# Altium schematic symbol library jlcpcb_2025_04_inductors_extended_0805.schlib: 882 symbols (part 4 of 5) (continued)
## MLZ2012M1R0HT000
designator L?  Inductance: 1uH
Inductor, 1uH, ±20%, 100mΩ, 800mA, SMD 0805; Manufacturer: TDK; Manufacturer Part Number: MLZ2012M1R0HT000; Saturation Current: 700mA; Package Size: 0805; JLCPCB Basic Part: No; JLCPCB Part Number: C383403; Supplier 1: LCSC; Category: Inductors; Supplier Part Number 1: C383403; Tolerance: ±20%; Rated Current: 800mA; DC Resistance: 100mΩ; RoHS: Yes; ComponentLink1Description: Datasheet; ComponentLink1URL: https://wmsc.lcsc.com/wmsc/upload/file/pdf/v2/lcsc/2304140030_TDK-MLZ2012M1R0HT000_C383403.pdf; ComponentLink2Description: JLCPCB Part URL; ComponentLink2URL: https://jlcpcb.com/partdetail/C383403; ComponentLink3Description: LCSC Part URL; ComponentLink3URL: https://lcsc.com/product-detail/Inductors-SMD_TDK-TDK-MLZ2012M1R0HT000_C383403.html
footprint IND-0805 (0805 (2012M) Inductor)
pins: 1, 2

## MLZ2012M1R0HTD25
designator L?  Inductance: 1uH
Inductor, 1uH, ±20%, 100mΩ, 800mA, SMD 0805; Manufacturer: TDK; Manufacturer Part Number: MLZ2012M1R0HTD25; Saturation Current: 700mA; Package Size: 0805; JLCPCB Basic Part: No; JLCPCB Part Number: C380016; Supplier 1: LCSC; Category: Inductors; Supplier Part Number 1: C380016; Tolerance: ±20%; Rated Current: 800mA; DC Resistance: 100mΩ; RoHS: Yes; ComponentLink1Description: Datasheet; ComponentLink1URL: https://wmsc.lcsc.com/wmsc/upload/file/pdf/v2/lcsc/1912111437_TDK-MLZ2012M1R0HTD25_C380016.pdf; ComponentLink2Description: JLCPCB Part URL; ComponentLink2URL: https://jlcpcb.com/partdetail/C380016; ComponentLink3Description: LCSC Part URL; ComponentLink3URL: https://lcsc.com/product-detail/Inductors-SMD_TDK-TDK-MLZ2012M1R0HTD25_C380016.html
footprint IND-0805 (0805 (2012M) Inductor)
pins: 1, 2

## MLZ2012M2R2HT000
designator L?  Inductance: 2.2uH
Inductor, 2.2uH, ±20%, 160mΩ, 600mA, SMD 0805; Manufacturer: TDK; Manufacturer Part Number: MLZ2012M2R2HT000; Saturation Current: 400mA; Self-Resonant Frequency: 2MHz; Package Size: 0805; JLCPCB Basic Part: No; JLCPCB Part Number: C383404; Supplier 1: LCSC; Category: Inductors; Supplier Part Number 1: C383404; Tolerance: ±20%; Rated Current: 600mA; DC Resistance: 160mΩ; RoHS: Yes; ComponentLink1Description: Datasheet; ComponentLink1URL: https://wmsc.lcsc.com/wmsc/upload/file/pdf/v2/lcsc/2304140030_TDK-MLZ2012M2R2HT000_C383404.pdf; ComponentLink2Description: JLCPCB Part URL; ComponentLink2URL: https://jlcpcb.com/partdetail/C383404; ComponentLink3Description: LCSC Part URL; ComponentLink3URL: https://lcsc.com/product-detail/Inductors-SMD_TDK-TDK-MLZ2012M2R2HT000_C383404.html
footprint IND-0805 (0805 (2012M) Inductor)
pins: 1, 2

## MLZ2012M3R3ATD69
designator L?  Inductance: 3.3uH
Inductor, 3.3uH, ±20%, 200mΩ, 500mA, SMD 0805; Manufacturer: TDK; Manufacturer Part Number: MLZ2012M3R3ATD69; Saturation Current: 350mA; Package Size: 0805; JLCPCB Basic Part: No; JLCPCB Part Number: C383406; Supplier 1: LCSC; Category: Inductors; Supplier Part Number 1: C383406; Tolerance: ±20%; Rated Current: 500mA; DC Resistance: 200mΩ; RoHS: Yes; ComponentLink1Description: Datasheet; ComponentLink1URL: https://wmsc.lcsc.com/wmsc/upload/file/pdf/v2/lcsc/2201242230_TDK-MLZ2012M3R3ATD69_C383406.pdf; ComponentLink2Description: JLCPCB Part URL; ComponentLink2URL: https://jlcpcb.com/partdetail/C383406; ComponentLink3Description: LCSC Part URL; ComponentLink3URL: https://lcsc.com/product-detail/Inductors-SMD_TDK-TDK-MLZ2012M3R3ATD69_C383406.html
footprint IND-0805 (0805 (2012M) Inductor)
pins: 1, 2

## MLZ2012M4R7HT000
designator L?  Inductance: 4.7uH
Inductor, 4.7uH, ±20%, 340mΩ, 400mA, SMD 0805; Manufacturer: TDK; Manufacturer Part Number: MLZ2012M4R7HT000; Saturation Current: 300mA; Self-Resonant Frequency: 2MHz; Package Size: 0805; JLCPCB Basic Part: No; JLCPCB Part Number: C383409; Supplier 1: LCSC; Category: Inductors; Supplier Part Number 1: C383409; Tolerance: ±20%; Rated Current: 400mA; DC Resistance: 340mΩ; RoHS: Yes; ComponentLink1Description: Datasheet; ComponentLink1URL: https://wmsc.lcsc.com/wmsc/upload/file/pdf/v2/lcsc/1912111437_TDK-MLZ2012M4R7HT000_C383409.pdf; ComponentLink2Description: JLCPCB Part URL; ComponentLink2URL: https://jlcpcb.com/partdetail/C383409; ComponentLink3Description: LCSC Part URL; ComponentLink3URL: https://lcsc.com/product-detail/Inductors-SMD_TDK-TDK-MLZ2012M4R7HT000_C383409.html
footprint IND-0805 (0805 (2012M) Inductor)
pins: 1, 2

## MLZ2012M6R8HT000
designator L?  Inductance: 6.8uH
Inductor, 6.8uH, ±20%, 400mΩ, 350mA, SMD 0805; Manufacturer: TDK; Manufacturer Part Number: MLZ2012M6R8HT000; Saturation Current: 220mA; Package Size: 0805; JLCPCB Basic Part: No; JLCPCB Part Number: C524463; Supplier 1: LCSC; Category: Inductors; Supplier Part Number 1: C524463; Tolerance: ±20%; Rated Current: 350mA; DC Resistance: 400mΩ; RoHS: Yes; ComponentLink1Description: Datasheet; ComponentLink1URL: https://wmsc.lcsc.com/wmsc/upload/file/pdf/v2/lcsc/2304140030_TDK-MLZ2012M6R8HT000_C524463.pdf; ComponentLink2Description: JLCPCB Part URL; ComponentLink2URL: https://jlcpcb.com/partdetail/C524463; ComponentLink3Description: LCSC Part URL; ComponentLink3URL: https://lcsc.com/product-detail/Inductors-SMD_TDK-TDK-MLZ2012M6R8HT000_C524463.html
footprint IND-0805 (0805 (2012M) Inductor)
pins: 1, 2

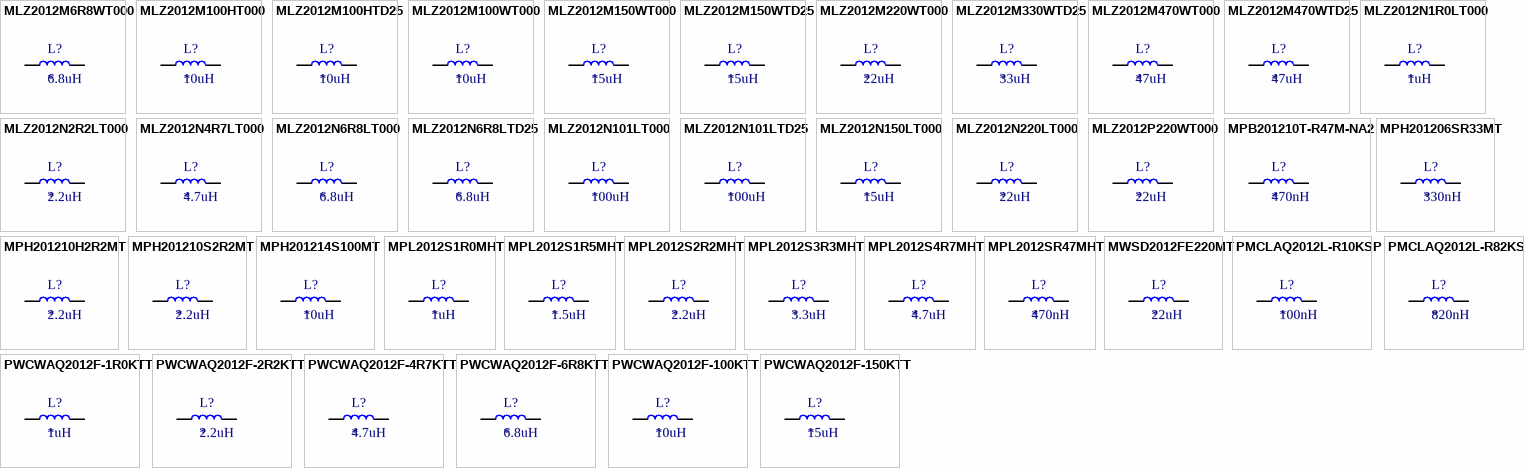
[diagram p17: symbols MLZ2012M6R8WT000 to PWCWAQ2012F-150KTT]

## MLZ2012M6R8WT000
designator L?  Inductance: 6.8uH
Inductor, 6.8uH, ±20%, 400mΩ, 400mA, SMD 0805; Manufacturer: TDK; Manufacturer Part Number: MLZ2012M6R8WT000; Saturation Current: 160mA; Package Size: 0805; JLCPCB Basic Part: No; JLCPCB Part Number: C383410; Supplier 1: LCSC; Category: Inductors; Supplier Part Number 1: C383410; Tolerance: ±20%; Rated Current: 400mA; DC Resistance: 400mΩ; RoHS: Yes; ComponentLink1Description: Datasheet; ComponentLink1URL: https://wmsc.lcsc.com/wmsc/upload/file/pdf/v2/lcsc/2304140030_TDK-MLZ2012M6R8WT000_C383410.pdf; ComponentLink2Description: JLCPCB Part URL; ComponentLink2URL: https://jlcpcb.com/partdetail/C383410; ComponentLink3Description: LCSC Part URL; ComponentLink3URL: https://lcsc.com/product-detail/Inductors-SMD_TDK-TDK-MLZ2012M6R8WT000_C383410.html
footprint IND-0805 (0805 (2012M) Inductor)
pins: 1, 2

## MLZ2012M100HT000
designator L?  Inductance: 10uH
Inductor, 10uH, ±20%, 680mΩ, 300mA, SMD 0805; Manufacturer: TDK; Manufacturer Part Number: MLZ2012M100HT000; Saturation Current: 200mA; Package Size: 0805; JLCPCB Basic Part: No; JLCPCB Part Number: C88172; Supplier 1: LCSC; Category: Inductors; Supplier Part Number 1: C88172; Tolerance: ±20%; Rated Current: 300mA; DC Resistance: 680mΩ; RoHS: Yes; ComponentLink1Description: Datasheet; ComponentLink1URL: https://wmsc.lcsc.com/wmsc/upload/file/pdf/v2/lcsc/2304140030_TDK-MLZ2012M100HT000_C88172.pdf; ComponentLink2Description: JLCPCB Part URL; ComponentLink2URL: https://jlcpcb.com/partdetail/C88172; ComponentLink3Description: LCSC Part URL; ComponentLink3URL: https://lcsc.com/product-detail/Inductors-SMD_TDK-TDK-MLZ2012M100HT000_C88172.html
footprint IND-0805 (0805 (2012M) Inductor)
pins: 1, 2

## MLZ2012M100HTD25
designator L?  Inductance: 10uH
Inductor, 10uH, ±20%, 680mΩ, 300mA, SMD 0805; Manufacturer: TDK; Manufacturer Part Number: MLZ2012M100HTD25; Saturation Current: 200mA; Package Size: 0805; JLCPCB Basic Part: No; JLCPCB Part Number: C404749; Supplier 1: LCSC; Category: Inductors; Supplier Part Number 1: C404749; Tolerance: ±20%; Rated Current: 300mA; DC Resistance: 680mΩ; RoHS: Yes; ComponentLink1Description: Datasheet; ComponentLink1URL: https://wmsc.lcsc.com/wmsc/upload/file/pdf/v2/lcsc/2304140030_TDK-MLZ2012M100HTD25_C404749.pdf; ComponentLink2Description: JLCPCB Part URL; ComponentLink2URL: https://jlcpcb.com/partdetail/C404749; ComponentLink3Description: LCSC Part URL; ComponentLink3URL: https://lcsc.com/product-detail/Inductors-SMD_TDK-TDK-MLZ2012M100HTD25_C404749.html
footprint IND-0805 (0805 (2012M) Inductor)
pins: 1, 2

## MLZ2012M100WT000
designator L?  Inductance: 10uH
Inductor, 10uH, ±20%, 470mΩ, 350mA, SMD 0805; Manufacturer: TDK; Manufacturer Part Number: MLZ2012M100WT000; Saturation Current: 150mA; Package Size: 0805; JLCPCB Basic Part: No; JLCPCB Part Number: C88173; Supplier 1: LCSC; Category: Inductors; Supplier Part Number 1: C88173; Tolerance: ±20%; Rated Current: 350mA; DC Resistance: 470mΩ; RoHS: Yes; ComponentLink1Description: Datasheet; ComponentLink1URL: https://wmsc.lcsc.com/wmsc/upload/file/pdf/v2/lcsc/2304140030_TDK-MLZ2012M100WT000_C88173.pdf; ComponentLink2Description: JLCPCB Part URL; ComponentLink2URL: https://jlcpcb.com/partdetail/C88173; ComponentLink3Description: LCSC Part URL; ComponentLink3URL: https://lcsc.com/product-detail/Inductors-SMD_TDK-TDK-MLZ2012M100WT000_C88173.html
footprint IND-0805 (0805 (2012M) Inductor)
pins: 1, 2

## MLZ2012M150WT000
designator L?  Inductance: 15uH
Inductor, 15uH, ±20%, 950mΩ, 250mA, SMD 0805; Manufacturer: TDK; Manufacturer Part Number: MLZ2012M150WT000; Saturation Current: 120mA; Self-Resonant Frequency: 2MHz; Package Size: 0805; JLCPCB Basic Part: No; JLCPCB Part Number: C383402; Supplier 1: LCSC; Category: Inductors; Supplier Part Number 1: C383402; Tolerance: ±20%; Rated Current: 250mA; DC Resistance: 950mΩ; RoHS: Yes; ComponentLink1Description: Datasheet; ComponentLink1URL: https://wmsc.lcsc.com/wmsc/upload/file/pdf/v2/lcsc/2304140030_TDK-MLZ2012M150WT000_C383402.pdf; ComponentLink2Description: JLCPCB Part URL; ComponentLink2URL: https://jlcpcb.com/partdetail/C383402; ComponentLink3Description: LCSC Part URL; ComponentLink3URL: https://lcsc.com/product-detail/Inductors-SMD_TDK-TDK-MLZ2012M150WT000_C383402.html
footprint IND-0805 (0805 (2012M) Inductor)
pins: 1, 2

## MLZ2012M150WTD25
designator L?  Inductance: 15uH
Inductor, 15uH, ±20%, 950mΩ, 250mA, SMD 0805; Manufacturer: TDK; Manufacturer Part Number: MLZ2012M150WTD25; Saturation Current: 120mA; Package Size: 0805; JLCPCB Basic Part: No; JLCPCB Part Number: C404760; Supplier 1: LCSC; Category: Inductors; Supplier Part Number 1: C404760; Tolerance: ±20%; Rated Current: 250mA; DC Resistance: 950mΩ; RoHS: Yes; ComponentLink1Description: Datasheet; ComponentLink1URL: https://wmsc.lcsc.com/wmsc/upload/file/pdf/v2/lcsc/2304140030_TDK-MLZ2012M150WTD25_C404760.pdf; ComponentLink2Description: JLCPCB Part URL; ComponentLink2URL: https://jlcpcb.com/partdetail/C404760; ComponentLink3Description: LCSC Part URL; ComponentLink3URL: https://lcsc.com/product-detail/Inductors-SMD_TDK-TDK-MLZ2012M150WTD25_C404760.html
footprint IND-0805 (0805 (2012M) Inductor)
pins: 1, 2

## MLZ2012M220WT000
designator L?  Inductance: 22uH
Inductor, 22uH, ±20%, 2Ω, 220mA, SMD 0805; Manufacturer: TDK; Manufacturer Part Number: MLZ2012M220WT000; Saturation Current: 60mA; Package Size: 0805; JLCPCB Basic Part: No; JLCPCB Part Number: C88174; Supplier 1: LCSC; Category: Inductors; Supplier Part Number 1: C88174; Tolerance: ±20%; Rated Current: 220mA; DC Resistance: 2Ω; RoHS: Yes; ComponentLink1Description: Datasheet; ComponentLink1URL: https://wmsc.lcsc.com/wmsc/upload/file/pdf/v2/lcsc/2304140030_TDK-MLZ2012M220WT000_C88174.pdf; ComponentLink2Description: JLCPCB Part URL; ComponentLink2URL: https://jlcpcb.com/partdetail/C88174; ComponentLink3Description: LCSC Part URL; ComponentLink3URL: https://lcsc.com/product-detail/Inductors-SMD_TDK-TDK-MLZ2012M220WT000_C88174.html
footprint IND-0805 (0805 (2012M) Inductor)
pins: 1, 2

## MLZ2012M330WTD25
designator L?  Inductance: 33uH
Inductor, 33uH, ±20%, 2.6Ω, 190mA, SMD 0805; Manufacturer: TDK; Manufacturer Part Number: MLZ2012M330WTD25; Saturation Current: 55mA; Package Size: 0805; JLCPCB Basic Part: No; JLCPCB Part Number: C404761; Supplier 1: LCSC; Category: Inductors; Supplier Part Number 1: C404761; Tolerance: ±20%; Rated Current: 190mA; DC Resistance: 2.6Ω; RoHS: Yes; ComponentLink1Description: Datasheet; ComponentLink1URL: https://wmsc.lcsc.com/wmsc/upload/file/pdf/v2/lcsc/2304140030_TDK-MLZ2012M330WTD25_C404761.pdf; ComponentLink2Description: JLCPCB Part URL; ComponentLink2URL: https://jlcpcb.com/partdetail/C404761; ComponentLink3Description: LCSC Part URL; ComponentLink3URL: https://lcsc.com/product-detail/Inductors-SMD_TDK-TDK-MLZ2012M330WTD25_C404761.html
footprint IND-0805 (0805 (2012M) Inductor)
pins: 1, 2

## MLZ2012M470WT000
designator L?  Inductance: 47uH
Inductor, 47uH, ±20%, 3.7Ω, 170mA, SMD 0805; Manufacturer: TDK; Manufacturer Part Number: MLZ2012M470WT000; Saturation Current: 50mA; Self-Resonant Frequency: 2MHz; Package Size: 0805; JLCPCB Basic Part: No; JLCPCB Part Number: C383408; Supplier 1: LCSC; Category: Inductors; Supplier Part Number 1: C383408; Tolerance: ±20%; Rated Current: 170mA; DC Resistance: 3.7Ω; RoHS: Yes; ComponentLink1Description: Datasheet; ComponentLink1URL: https://wmsc.lcsc.com/wmsc/upload/file/pdf/v2/lcsc/2304140030_TDK-MLZ2012M470WT000_C383408.pdf; ComponentLink2Description: JLCPCB Part URL; ComponentLink2URL: https://jlcpcb.com/partdetail/C383408; ComponentLink3Description: LCSC Part URL; ComponentLink3URL: https://lcsc.com/product-detail/Inductors-SMD_TDK-TDK-MLZ2012M470WT000_C383408.html
footprint IND-0805 (0805 (2012M) Inductor)
pins: 1, 2

## MLZ2012M470WTD25
designator L?  Inductance: 47uH
Inductor, 47uH, ±20%, 3.7Ω, 170mA, SMD 0805; Manufacturer: TDK; Manufacturer Part Number: MLZ2012M470WTD25; Saturation Current: 50mA; Package Size: 0805; JLCPCB Basic Part: No; JLCPCB Part Number: C404762; Supplier 1: LCSC; Category: Inductors; Supplier Part Number 1: C404762; Tolerance: ±20%; Rated Current: 170mA; DC Resistance: 3.7Ω; RoHS: Yes; ComponentLink1Description: Datasheet; ComponentLink1URL: https://wmsc.lcsc.com/wmsc/upload/file/pdf/v2/lcsc/2304140030_TDK-MLZ2012M470WTD25_C404762.pdf; ComponentLink2Description: JLCPCB Part URL; ComponentLink2URL: https://jlcpcb.com/partdetail/C404762; ComponentLink3Description: LCSC Part URL; ComponentLink3URL: https://lcsc.com/product-detail/Inductors-SMD_TDK-TDK-MLZ2012M470WTD25_C404762.html
footprint IND-0805 (0805 (2012M) Inductor)
pins: 1, 2

## MLZ2012N1R0LT000
designator L?  Inductance: 1uH
Inductor, 1uH, ±20%, 60mΩ, 1.15A, SMD 0805; Manufacturer: TDK; Manufacturer Part Number: MLZ2012N1R0LT000; Saturation Current: 220mA; Self-Resonant Frequency: 2MHz; Package Size: 0805; JLCPCB Basic Part: No; JLCPCB Part Number: C307753; Supplier 1: LCSC; Category: Inductors; Supplier Part Number 1: C307753; Tolerance: ±20%; Rated Current: 1.15A; DC Resistance: 60mΩ; RoHS: Yes; ComponentLink1Description: Datasheet; ComponentLink1URL: https://wmsc.lcsc.com/wmsc/upload/file/pdf/v2/lcsc/1811121712_TDK-MLZ2012N1R0LT000_C307753.pdf; ComponentLink2Description: JLCPCB Part URL; ComponentLink2URL: https://jlcpcb.com/partdetail/C307753; ComponentLink3Description: LCSC Part URL; ComponentLink3URL: https://lcsc.com/product-detail/Inductors-SMD_TDK-TDK-MLZ2012N1R0LT000_C307753.html
footprint IND-0805 (0805 (2012M) Inductor)
pins: 1, 2

## MLZ2012N2R2LT000
designator L?  Inductance: 2.2uH
Inductor, 2.2uH, ±20%, 120mΩ, 800mA, SMD 0805; Manufacturer: TDK; Manufacturer Part Number: MLZ2012N2R2LT000; Saturation Current: 170mA; Package Size: 0805; JLCPCB Basic Part: No; JLCPCB Part Number: C531291; Supplier 1: LCSC; Category: Inductors; Supplier Part Number 1: C531291; Tolerance: ±20%; Rated Current: 800mA; DC Resistance: 120mΩ; RoHS: Yes; ComponentLink1Description: Datasheet; ComponentLink1URL: https://wmsc.lcsc.com/wmsc/upload/file/pdf/v2/lcsc/2006191008_TDK-MLZ2012N2R2LT000_C531291.pdf; ComponentLink2Description: JLCPCB Part URL; ComponentLink2URL: https://jlcpcb.com/partdetail/C531291; ComponentLink3Description: LCSC Part URL; ComponentLink3URL: https://lcsc.com/product-detail/Inductors-SMD_TDK-TDK-MLZ2012N2R2LT000_C531291.html
footprint IND-0805 (0805 (2012M) Inductor)
pins: 1, 2

## MLZ2012N4R7LT000
designator L?  Inductance: 4.7uH
Inductor, 4.7uH, ±20%, 180mΩ, 600mA, SMD 0805; Manufacturer: TDK; Manufacturer Part Number: MLZ2012N4R7LT000; Saturation Current: 130mA; Self-Resonant Frequency: 2MHz; Package Size: 0805; JLCPCB Basic Part: No; JLCPCB Part Number: C383412; Supplier 1: LCSC; Category: Inductors; Supplier Part Number 1: C383412; Tolerance: ±20%; Rated Current: 600mA; DC Resistance: 180mΩ; RoHS: Yes; ComponentLink1Description: Datasheet; ComponentLink1URL: https://wmsc.lcsc.com/wmsc/upload/file/pdf/v2/lcsc/2304140030_TDK-MLZ2012N4R7LT000_C383412.pdf; ComponentLink2Description: JLCPCB Part URL; ComponentLink2URL: https://jlcpcb.com/partdetail/C383412; ComponentLink3Description: LCSC Part URL; ComponentLink3URL: https://lcsc.com/product-detail/Inductors-SMD_TDK-TDK-MLZ2012N4R7LT000_C383412.html
footprint IND-0805 (0805 (2012M) Inductor)
pins: 1, 2

## MLZ2012N6R8LT000
designator L?  Inductance: 6.8uH
Inductor, 6.8uH, ±20%, 250mΩ, 550mA, SMD 0805; Manufacturer: TDK; Manufacturer Part Number: MLZ2012N6R8LT000; Saturation Current: 110mA; Self-Resonant Frequency: 2MHz; Package Size: 0805; JLCPCB Basic Part: No; JLCPCB Part Number: C82157; Supplier 1: LCSC; Category: Inductors; Supplier Part Number 1: C82157; Tolerance: ±20%; Rated Current: 550mA; DC Resistance: 250mΩ; RoHS: Yes; ComponentLink1Description: Datasheet; ComponentLink1URL: https://wmsc.lcsc.com/wmsc/upload/file/pdf/v2/lcsc/2304140030_TDK-MLZ2012N6R8LT000_C82157.pdf; ComponentLink2Description: JLCPCB Part URL; ComponentLink2URL: https://jlcpcb.com/partdetail/C82157; ComponentLink3Description: LCSC Part URL; ComponentLink3URL: https://lcsc.com/product-detail/Inductors-SMD_TDK-TDK-MLZ2012N6R8LT000_C82157.html
footprint IND-0805 (0805 (2012M) Inductor)
pins: 1, 2

## MLZ2012N6R8LTD25
designator L?  Inductance: 6.8uH
Inductor, 6.8uH, ±20%, 250mΩ, 550mA, SMD 0805; Manufacturer: TDK; Manufacturer Part Number: MLZ2012N6R8LTD25; Saturation Current: 110mA; Package Size: 0805; JLCPCB Basic Part: No; JLCPCB Part Number: C404768; Supplier 1: LCSC; Category: Inductors; Supplier Part Number 1: C404768; Tolerance: ±20%; Rated Current: 550mA; DC Resistance: 250mΩ; RoHS: Yes; ComponentLink1Description: Datasheet; ComponentLink1URL: https://wmsc.lcsc.com/wmsc/upload/file/pdf/v2/lcsc/2304140030_TDK-MLZ2012N6R8LTD25_C404768.pdf; ComponentLink2Description: JLCPCB Part URL; ComponentLink2URL: https://jlcpcb.com/partdetail/C404768; ComponentLink3Description: LCSC Part URL; ComponentLink3URL: https://lcsc.com/product-detail/Inductors-SMD_TDK-TDK-MLZ2012N6R8LTD25_C404768.html
footprint IND-0805 (0805 (2012M) Inductor)
pins: 1, 2

## MLZ2012N101LT000
designator L?  Inductance: 100uH
Inductor, 100uH, ±20%, 3.5Ω, 140mA, SMD 0805; Manufacturer: TDK; Manufacturer Part Number: MLZ2012N101LT000; Saturation Current: 30mA; Package Size: 0805; JLCPCB Basic Part: No; JLCPCB Part Number: C88184; Supplier 1: LCSC; Category: Inductors; Supplier Part Number 1: C88184; Tolerance: ±20%; Rated Current: 140mA; DC Resistance: 3.5Ω; RoHS: Yes; ComponentLink1Description: Datasheet; ComponentLink1URL: https://wmsc.lcsc.com/wmsc/upload/file/pdf/v2/lcsc/1810241227_TDK-MLZ2012N101LT000_C88184.pdf; ComponentLink2Description: JLCPCB Part URL; ComponentLink2URL: https://jlcpcb.com/partdetail/C88184; ComponentLink3Description: LCSC Part URL; ComponentLink3URL: https://lcsc.com/product-detail/Inductors-SMD_TDK-TDK-MLZ2012N101LT000_C88184.html
footprint IND-0805 (0805 (2012M) Inductor)
pins: 1, 2

## MLZ2012N101LTD25
designator L?  Inductance: 100uH
Inductor, 100uH, ±20%, 3.5Ω, SMD 0805; Manufacturer: TDK; Manufacturer Part Number: MLZ2012N101LTD25; Saturation Current: 30mA; Package Size: 0805; JLCPCB Basic Part: No; JLCPCB Part Number: C307752; Supplier 1: LCSC; Category: Inductors; Supplier Part Number 1: C307752; Tolerance: ±20%; DC Resistance: 3.5Ω; RoHS: Yes; ComponentLink1Description: Datasheet; ComponentLink1URL: https://wmsc.lcsc.com/wmsc/upload/file/pdf/v2/lcsc/2401221239_TDK-MLZ2012N101LTD25_C307752.pdf; ComponentLink2Description: JLCPCB Part URL; ComponentLink2URL: https://jlcpcb.com/partdetail/C307752; ComponentLink3Description: LCSC Part URL; ComponentLink3URL: https://lcsc.com/product-detail/Inductors-SMD_TDK-TDK-MLZ2012N101LTD25_C307752.html
footprint IND-0805 (0805 (2012M) Inductor)
pins: 1, 2

## MLZ2012N150LT000
designator L?  Inductance: 15uH
Inductor, 15uH, ±20%, 470mΩ, 350mA, SMD 0805; Manufacturer: TDK; Manufacturer Part Number: MLZ2012N150LT000; Saturation Current: 90mA; Package Size: 0805; JLCPCB Basic Part: No; JLCPCB Part Number: C531290; Supplier 1: LCSC; Category: Inductors; Supplier Part Number 1: C531290; Tolerance: ±20%; Rated Current: 350mA; DC Resistance: 470mΩ; RoHS: Yes; ComponentLink1Description: Datasheet; ComponentLink1URL: https://wmsc.lcsc.com/wmsc/upload/file/pdf/v2/lcsc/2304140030_TDK-MLZ2012N150LT000_C531290.pdf; ComponentLink2Description: JLCPCB Part URL; ComponentLink2URL: https://jlcpcb.com/partdetail/C531290; ComponentLink3Description: LCSC Part URL; ComponentLink3URL: https://lcsc.com/product-detail/Inductors-SMD_TDK-TDK-MLZ2012N150LT000_C531290.html
footprint IND-0805 (0805 (2012M) Inductor)
pins: 1, 2

## MLZ2012N220LT000
designator L?  Inductance: 22uH
Inductor, 22uH, ±20%, 670mΩ, 300mA, SMD 0805; Manufacturer: TDK; Manufacturer Part Number: MLZ2012N220LT000; Saturation Current: 70mA; Package Size: 0805; JLCPCB Basic Part: No; JLCPCB Part Number: C383411; Supplier 1: LCSC; Category: Inductors; Supplier Part Number 1: C383411; Tolerance: ±20%; Rated Current: 300mA; DC Resistance: 670mΩ; RoHS: Yes; ComponentLink1Description: Datasheet; ComponentLink1URL: https://wmsc.lcsc.com/wmsc/upload/file/pdf/v2/lcsc/2304140030_TDK-MLZ2012N220LT000_C383411.pdf; ComponentLink2Description: JLCPCB Part URL; ComponentLink2URL: https://jlcpcb.com/partdetail/C383411; ComponentLink3Description: LCSC Part URL; ComponentLink3URL: https://lcsc.com/product-detail/Inductors-SMD_TDK-TDK-MLZ2012N220LT000_C383411.html
footprint IND-0805 (0805 (2012M) Inductor)
pins: 1, 2

## MLZ2012P220WT000
designator L?  Inductance: 22uH
Inductor, 22uH, ±20%, 1.25Ω, 220mA, SMD 0805; Manufacturer: TDK; Manufacturer Part Number: MLZ2012P220WT000; Saturation Current: 100mA; Package Size: 0805; JLCPCB Basic Part: No; JLCPCB Part Number: C88185; Supplier 1: LCSC; Category: Inductors; Supplier Part Number 1: C88185; Tolerance: ±20%; Rated Current: 220mA; DC Resistance: 1.25Ω; RoHS: Yes; ComponentLink1Description: Datasheet; ComponentLink1URL: https://wmsc.lcsc.com/wmsc/upload/file/pdf/v2/lcsc/1810132031_TDK-MLZ2012P220WT000_C88185.pdf; ComponentLink2Description: JLCPCB Part URL; ComponentLink2URL: https://jlcpcb.com/partdetail/C88185; ComponentLink3Description: LCSC Part URL; ComponentLink3URL: https://lcsc.com/product-detail/Inductors-SMD_TDK-TDK-MLZ2012P220WT000_C88185.html
footprint IND-0805 (0805 (2012M) Inductor)
pins: 1, 2

## MPB201210T-R47M-NA2
designator L?  Inductance: 470nH
Inductor, 470nH, ±20%, 90mΩ, 1.3A, SMD 0805; Manufacturer: Chilisin Elec; Manufacturer Part Number: MPB201210T-R47M-NA2; Package Size: 0805; JLCPCB Basic Part: No; JLCPCB Part Number: C320443; Supplier 1: LCSC; Category: Inductors; Supplier Part Number 1: C320443; Tolerance: ±20%; Rated Current: 1.3A; DC Resistance: 90mΩ; RoHS: Yes; ComponentLink1Description: Datasheet; ComponentLink1URL: https://wmsc.lcsc.com/wmsc/upload/file/pdf/v2/lcsc/1811051131_Chilisin-Elec-MPB201210T-R47M-NA2_C320443.pdf; ComponentLink2Description: JLCPCB Part URL; ComponentLink2URL: https://jlcpcb.com/partdetail/C320443; ComponentLink3Description: LCSC Part URL; ComponentLink3URL: https://lcsc.com/product-detail/Inductors-SMD_Chilisin-Elec-Chilisin-Elec-MPB201210T-R47M-NA2_C320443.html
footprint IND-0805 (0805 (2012M) Inductor)
pins: 1, 2

## MPH201206SR33MT
designator L?  Inductance: 330nH
Inductor, 330nH, ±20%, 125mΩ, 1.2A, SMD 0805; Manufacturer: Sunlord; Manufacturer Part Number: MPH201206SR33MT; Self-Resonant Frequency: 90MHz; Package Size: 0805; JLCPCB Basic Part: No; JLCPCB Part Number: C5676579; Supplier 1: LCSC; Category: Inductors; Supplier Part Number 1: C5676579; Tolerance: ±20%; Rated Current: 1.2A; Saturation Current: 1.2A; DC Resistance: 125mΩ; RoHS: Yes; ComponentLink1Description: Datasheet; ComponentLink1URL: https://wmsc.lcsc.com/wmsc/upload/file/pdf/v2/lcsc/2310311742_Sunlord-MPH201206SR33MT_C5676579.pdf; ComponentLink2Description: JLCPCB Part URL; ComponentLink2URL: https://jlcpcb.com/partdetail/C5676579; ComponentLink3Description: LCSC Part URL; ComponentLink3URL: https://lcsc.com/product-detail/Inductors-SMD_Sunlord-Sunlord-MPH201206SR33MT_C5676579.html
footprint IND-0805 (0805 (2012M) Inductor)
pins: 1, 2

## MPH201210H2R2MT
designator L?  Inductance: 2.2uH
Inductor, 2.2uH, ±20%, 200mΩ, 500mA, SMD 0805; Manufacturer: Sunlord; Manufacturer Part Number: MPH201210H2R2MT; Package Size: 0805; JLCPCB Basic Part: No; JLCPCB Part Number: C279882; Supplier 1: LCSC; Category: Inductors; Supplier Part Number 1: C279882; Tolerance: ±20%; Rated Current: 500mA; DC Resistance: 200mΩ; RoHS: Yes; ComponentLink1Description: Datasheet; ComponentLink1URL: https://wmsc.lcsc.com/wmsc/upload/file/pdf/v2/lcsc/2310301640_Sunlord-MPH201210H2R2MT_C279882.pdf; ComponentLink2Description: JLCPCB Part URL; ComponentLink2URL: https://jlcpcb.com/partdetail/C279882; ComponentLink3Description: LCSC Part URL; ComponentLink3URL: https://lcsc.com/product-detail/Inductors-SMD_Sunlord-Sunlord-MPH201210H2R2MT_C279882.html
footprint IND-0805 (0805 (2012M) Inductor)
pins: 1, 2

## MPH201210S2R2MT
designator L?  Inductance: 2.2uH
Inductor, 2.2uH, ±20%, 250mΩ, 900mA, SMD 0805; Manufacturer: Sunlord; Manufacturer Part Number: MPH201210S2R2MT; Saturation Current: 420mA; Self-Resonant Frequency: 1MHz; Package Size: 0805; JLCPCB Basic Part: No; JLCPCB Part Number: C55755; Supplier 1: LCSC; Category: Inductors; Supplier Part Number 1: C55755; Tolerance: ±20%; Rated Current: 900mA; DC Resistance: 250mΩ; RoHS: Yes; ComponentLink1Description: Datasheet; ComponentLink1URL: https://wmsc.lcsc.com/wmsc/upload/file/pdf/v2/lcsc/2310301640_Sunlord-MPH201210S2R2MT_C55755.pdf; ComponentLink2Description: JLCPCB Part URL; ComponentLink2URL: https://jlcpcb.com/partdetail/C55755; ComponentLink3Description: LCSC Part URL; ComponentLink3URL: https://lcsc.com/product-detail/Inductors-SMD_Sunlord-Sunlord-MPH201210S2R2MT_C55755.html
footprint IND-0805 (0805 (2012M) Inductor)
pins: 1, 2

## MPH201214S100MT
designator L?  Inductance: 10uH
Inductor, 10uH, ±20%, 375mΩ, 110mA, SMD 0805; Manufacturer: Sunlord; Manufacturer Part Number: MPH201214S100MT; Self-Resonant Frequency: 1MHz; Package Size: 0805; JLCPCB Basic Part: No; JLCPCB Part Number: C192450; Supplier 1: LCSC; Category: Inductors; Supplier Part Number 1: C192450; Tolerance: ±20%; Rated Current: 110mA; Saturation Current: 110mA; DC Resistance: 375mΩ; RoHS: Yes; ComponentLink1Description: Datasheet; ComponentLink1URL: https://wmsc.lcsc.com/wmsc/upload/file/pdf/v2/lcsc/2310301640_Sunlord-MPH201214S100MT_C192450.pdf; ComponentLink2Description: JLCPCB Part URL; ComponentLink2URL: https://jlcpcb.com/partdetail/C192450; ComponentLink3Description: LCSC Part URL; ComponentLink3URL: https://lcsc.com/product-detail/Inductors-SMD_Sunlord-Sunlord-MPH201214S100MT_C192450.html
footprint IND-0805 (0805 (2012M) Inductor)
pins: 1, 2

## MPL2012S1R0MHT
designator L?  Inductance: 1uH
Inductor, 1uH, ±20%, 190mΩ, 1A, SMD 0805; Manufacturer: Sunlord; Manufacturer Part Number: MPL2012S1R0MHT; Package Size: 0805; JLCPCB Basic Part: No; JLCPCB Part Number: C98332; Supplier 1: LCSC; Category: Inductors; Supplier Part Number 1: C98332; Tolerance: ±20%; Rated Current: 1A; DC Resistance: 190mΩ; RoHS: Yes; ComponentLink1Description: Datasheet; ComponentLink1URL: https://wmsc.lcsc.com/wmsc/upload/file/pdf/v2/lcsc/2304140030_Sunlord-MPL2012S1R0MHT_C98332.pdf; ComponentLink2Description: JLCPCB Part URL; ComponentLink2URL: https://jlcpcb.com/partdetail/C98332; ComponentLink3Description: LCSC Part URL; ComponentLink3URL: https://lcsc.com/product-detail/Power-Inductors_Sunlord-Sunlord-MPL2012S1R0MHT_C98332.html
footprint IND-0805 (0805 (2012M) Inductor)
pins: 1, 2

## MPL2012S1R5MHT
designator L?  Inductance: 1.5uH
Inductor, 1.5uH, ±20%, 160mΩ, 900mA, SMD 0805; Manufacturer: Sunlord; Manufacturer Part Number: MPL2012S1R5MHT; Package Size: 0805; JLCPCB Basic Part: No; JLCPCB Part Number: C334245; Supplier 1: LCSC; Category: Inductors; Supplier Part Number 1: C334245; Tolerance: ±20%; Rated Current: 900mA; DC Resistance: 160mΩ; RoHS: Yes; ComponentLink1Description: Datasheet; ComponentLink1URL: https://wmsc.lcsc.com/wmsc/upload/file/pdf/v2/lcsc/2304140030_Sunlord-MPL2012S1R5MHT_C334245.pdf; ComponentLink2Description: JLCPCB Part URL; ComponentLink2URL: https://jlcpcb.com/partdetail/C334245; ComponentLink3Description: LCSC Part URL; ComponentLink3URL: https://lcsc.com/product-detail/Power-Inductors_Sunlord-Sunlord-MPL2012S1R5MHT_C334245.html
footprint IND-0805 (0805 (2012M) Inductor)
pins: 1, 2

## MPL2012S2R2MHT
designator L?  Inductance: 2.2uH
Inductor, 2.2uH, ±20%, 250mΩ, 800mA, SMD 0805; Manufacturer: Sunlord; Manufacturer Part Number: MPL2012S2R2MHT; Package Size: 0805; JLCPCB Basic Part: No; JLCPCB Part Number: C63167; Supplier 1: LCSC; Category: Inductors; Supplier Part Number 1: C63167; Tolerance: ±20%; Rated Current: 800mA; DC Resistance: 250mΩ; RoHS: Yes; ComponentLink1Description: Datasheet; ComponentLink1URL: https://wmsc.lcsc.com/wmsc/upload/file/pdf/v2/lcsc/2304140030_Sunlord-MPL2012S2R2MHT_C63167.pdf; ComponentLink2Description: JLCPCB Part URL; ComponentLink2URL: https://jlcpcb.com/partdetail/C63167; ComponentLink3Description: LCSC Part URL; ComponentLink3URL: https://lcsc.com/product-detail/Power-Inductors_Sunlord-Sunlord-MPL2012S2R2MHT_C63167.html
footprint IND-0805 (0805 (2012M) Inductor)
pins: 1, 2

## MPL2012S3R3MHT
designator L?  Inductance: 3.3uH
Inductor, 3.3uH, ±20%, 190mΩ, 900mA, SMD 0805; Manufacturer: Sunlord; Manufacturer Part Number: MPL2012S3R3MHT; Package Size: 0805; JLCPCB Basic Part: No; JLCPCB Part Number: C98331; Supplier 1: LCSC; Category: Inductors; Supplier Part Number 1: C98331; Tolerance: ±20%; Rated Current: 900mA; DC Resistance: 190mΩ; RoHS: Yes; ComponentLink1Description: Datasheet; ComponentLink1URL: https://wmsc.lcsc.com/wmsc/upload/file/pdf/v2/lcsc/2304140030_Sunlord-MPL2012S3R3MHT_C98331.pdf; ComponentLink2Description: JLCPCB Part URL; ComponentLink2URL: https://jlcpcb.com/partdetail/C98331; ComponentLink3Description: LCSC Part URL; ComponentLink3URL: https://lcsc.com/product-detail/Power-Inductors_Sunlord-Sunlord-MPL2012S3R3MHT_C98331.html
footprint IND-0805 (0805 (2012M) Inductor)
pins: 1, 2

## MPL2012S4R7MHT
designator L?  Inductance: 4.7uH
Inductor, 4.7uH, ±20%, 250mΩ, 800mA, SMD 0805; Manufacturer: Sunlord; Manufacturer Part Number: MPL2012S4R7MHT; Package Size: 0805; JLCPCB Basic Part: No; JLCPCB Part Number: C63166; Supplier 1: LCSC; Category: Inductors; Supplier Part Number 1: C63166; Tolerance: ±20%; Rated Current: 800mA; DC Resistance: 250mΩ; RoHS: Yes; ComponentLink1Description: Datasheet; ComponentLink1URL: https://wmsc.lcsc.com/wmsc/upload/file/pdf/v2/lcsc/2304140030_Sunlord-MPL2012S4R7MHT_C63166.pdf; ComponentLink2Description: JLCPCB Part URL; ComponentLink2URL: https://jlcpcb.com/partdetail/C63166; ComponentLink3Description: LCSC Part URL; ComponentLink3URL: https://lcsc.com/product-detail/Power-Inductors_Sunlord-Sunlord-MPL2012S4R7MHT_C63166.html
footprint IND-0805 (0805 (2012M) Inductor)
pins: 1, 2

## MPL2012SR47MHT
designator L?  Inductance: 470nH
Inductor, 470nH, ±20%, 110mΩ, 1A, SMD 0805; Manufacturer: Sunlord; Manufacturer Part Number: MPL2012SR47MHT; Package Size: 0805; JLCPCB Basic Part: No; JLCPCB Part Number: C192439; Supplier 1: LCSC; Category: Inductors; Supplier Part Number 1: C192439; Tolerance: ±20%; Rated Current: 1A; DC Resistance: 110mΩ; RoHS: Yes; ComponentLink1Description: Datasheet; ComponentLink1URL: https://wmsc.lcsc.com/wmsc/upload/file/pdf/v2/lcsc/2304140030_Sunlord-MPL2012SR47MHT_C192439.pdf; ComponentLink2Description: JLCPCB Part URL; ComponentLink2URL: https://jlcpcb.com/partdetail/C192439; ComponentLink3Description: LCSC Part URL; ComponentLink3URL: https://lcsc.com/product-detail/Power-Inductors_Sunlord-Sunlord-MPL2012SR47MHT_C192439.html
footprint IND-0805 (0805 (2012M) Inductor)
pins: 1, 2

## MWSD2012FE220MT
designator L?  Inductance: 22uH
Inductor, 22uH, ±20%, 1.76Ω, 340mA, SMD 0805; Manufacturer: Sunlord; Manufacturer Part Number: MWSD2012FE220MT; Self-Resonant Frequency: 20MHz; Package Size: 0805; JLCPCB Basic Part: No; JLCPCB Part Number: C2838027; Supplier 1: LCSC; Category: Inductors; Supplier Part Number 1: C2838027; Tolerance: ±20%; Rated Current: 340mA; DC Resistance: 1.76Ω; RoHS: Yes; ComponentLink1Description: Datasheet; ComponentLink1URL: https://wmsc.lcsc.com/wmsc/upload/file/pdf/v2/lcsc/2310301640_Sunlord-MWSD2012FE220MT_C2838027.pdf; ComponentLink2Description: JLCPCB Part URL; ComponentLink2URL: https://jlcpcb.com/partdetail/C2838027; ComponentLink3Description: LCSC Part URL; ComponentLink3URL: https://lcsc.com/product-detail/Inductors-SMD_Sunlord-Sunlord-MWSD2012FE220MT_C2838027.html
footprint IND-0805 (0805 (2012M) Inductor)
pins: 1, 2

## PMCLAQ2012L-R10KSP
designator L?  Inductance: 100nH
Inductor, 100nH, ±10%, 300mΩ, 250mA, SMD 0805; Manufacturer: PROD Tech; Manufacturer Part Number: PMCLAQ2012L-R10KSP; Self-Resonant Frequency: 235MHz; Q Factor: 20@25MHz; Package Size: 0805; JLCPCB Basic Part: No; JLCPCB Part Number: C436263; Supplier 1: LCSC; Category: Inductors; Supplier Part Number 1: C436263; Tolerance: ±10%; Rated Current: 250mA; DC Resistance: 300mΩ; RoHS: Yes; ComponentLink1Description: Datasheet; ComponentLink1URL: https://wmsc.lcsc.com/wmsc/upload/file/pdf/v2/lcsc/2011271608_PROD-Tech-PMCLAQ2012L-R10KSP_C436263.pdf; ComponentLink2Description: JLCPCB Part URL; ComponentLink2URL: https://jlcpcb.com/partdetail/C436263; ComponentLink3Description: LCSC Part URL; ComponentLink3URL: https://lcsc.com/product-detail/Inductors-SMD_PROD-Tech-PROD-Tech-PMCLAQ2012L-R10KSP_C436263.html
footprint IND-0805 (0805 (2012M) Inductor)
pins: 1, 2

## PMCLAQ2012L-R82KSP
designator L?  Inductance: 820nH
Inductor, 820nH, ±10%, 1Ω, 150mA, SMD 0805; Manufacturer: PROD Tech; Manufacturer Part Number: PMCLAQ2012L-R82KSP; Self-Resonant Frequency: 100MHz; Package Size: 0805; JLCPCB Basic Part: No; JLCPCB Part Number: C436264; Supplier 1: LCSC; Category: Inductors; Supplier Part Number 1: C436264; Tolerance: ±10%; Rated Current: 150mA; DC Resistance: 1Ω; RoHS: Yes; ComponentLink1Description: Datasheet; ComponentLink1URL: https://wmsc.lcsc.com/wmsc/upload/file/pdf/v2/lcsc/2011271608_PROD-Tech-PMCLAQ2012L-R82KSP_C436264.pdf; ComponentLink2Description: JLCPCB Part URL; ComponentLink2URL: https://jlcpcb.com/partdetail/C436264; ComponentLink3Description: LCSC Part URL; ComponentLink3URL: https://lcsc.com/product-detail/Inductors-SMD_PROD-Tech-PROD-Tech-PMCLAQ2012L-R82KSP_C436264.html
footprint IND-0805 (0805 (2012M) Inductor)
pins: 1, 2

## PWCWAQ2012F-1R0KTT
designator L?  Inductance: 1uH
Inductor, 1uH, ±10%, 169mΩ, 1.3A, SMD 0805; Manufacturer: PROD Tech; Manufacturer Part Number: PWCWAQ2012F-1R0KTT; Package Size: 0805; JLCPCB Basic Part: No; JLCPCB Part Number: C436787; Supplier 1: LCSC; Category: Inductors; Supplier Part Number 1: C436787; Tolerance: ±10%; Rated Current: 1.3A; DC Resistance: 169mΩ; RoHS: Yes; ComponentLink1Description: Datasheet; ComponentLink1URL: https://wmsc.lcsc.com/wmsc/upload/file/pdf/v2/lcsc/2211161730_PROD-Tech-PWCWAQ2012F-1R0KTT_C436787.pdf; ComponentLink2Description: JLCPCB Part URL; ComponentLink2URL: https://jlcpcb.com/partdetail/C436787; ComponentLink3Description: LCSC Part URL; ComponentLink3URL: https://lcsc.com/product-detail/Inductors-SMD_PROD-Tech-PROD-Tech-PWCWAQ2012F-1R0KTT_C436787.html
footprint IND-0805 (0805 (2012M) Inductor)
pins: 1, 2

## PWCWAQ2012F-2R2KTT
designator L?  Inductance: 2.2uH
Inductor, 2.2uH, ±10%, 286mΩ, 1.04A, SMD 0805; Manufacturer: PROD Tech; Manufacturer Part Number: PWCWAQ2012F-2R2KTT; Package Size: 0805; JLCPCB Basic Part: No; JLCPCB Part Number: C436788; Supplier 1: LCSC; Category: Inductors; Supplier Part Number 1: C436788; Tolerance: ±10%; Rated Current: 1.04A; DC Resistance: 286mΩ; RoHS: Yes; ComponentLink1Description: Datasheet; ComponentLink1URL: https://wmsc.lcsc.com/wmsc/upload/file/pdf/v2/lcsc/2211161730_PROD-Tech-PWCWAQ2012F-2R2KTT_C436788.pdf; ComponentLink2Description: JLCPCB Part URL; ComponentLink2URL: https://jlcpcb.com/partdetail/C436788; ComponentLink3Description: LCSC Part URL; ComponentLink3URL: https://lcsc.com/product-detail/Inductors-SMD_PROD-Tech-PROD-Tech-PWCWAQ2012F-2R2KTT_C436788.html
footprint IND-0805 (0805 (2012M) Inductor)
pins: 1, 2

## PWCWAQ2012F-4R7KTT
designator L?  Inductance: 4.7uH
Inductor, 4.7uH, ±10%, 559mΩ, 840mA, SMD 0805; Manufacturer: PROD Tech; Manufacturer Part Number: PWCWAQ2012F-4R7KTT; Package Size: 0805; JLCPCB Basic Part: No; JLCPCB Part Number: C436789; Supplier 1: LCSC; Category: Inductors; Supplier Part Number 1: C436789; Tolerance: ±10%; Rated Current: 840mA; DC Resistance: 559mΩ; RoHS: Yes; ComponentLink1Description: Datasheet; ComponentLink1URL: https://wmsc.lcsc.com/wmsc/upload/file/pdf/v2/lcsc/2211161730_PROD-Tech-PWCWAQ2012F-4R7KTT_C436789.pdf; ComponentLink2Description: JLCPCB Part URL; ComponentLink2URL: https://jlcpcb.com/partdetail/C436789; ComponentLink3Description: LCSC Part URL; ComponentLink3URL: https://lcsc.com/product-detail/Inductors-SMD_PROD-Tech-PROD-Tech-PWCWAQ2012F-4R7KTT_C436789.html
footprint IND-0805 (0805 (2012M) Inductor)
pins: 1, 2

## PWCWAQ2012F-6R8KTT
designator L?  Inductance: 6.8uH
Inductor, 6.8uH, ±10%, 884mΩ, 700mA, SMD 0805; Manufacturer: PROD Tech; Manufacturer Part Number: PWCWAQ2012F-6R8KTT; Package Size: 0805; JLCPCB Basic Part: No; JLCPCB Part Number: C2983047; Supplier 1: LCSC; Category: Inductors; Supplier Part Number 1: C2983047; Tolerance: ±10%; Rated Current: 700mA; DC Resistance: 884mΩ; RoHS: Yes; ComponentLink1Description: Datasheet; ComponentLink1URL: https://wmsc.lcsc.com/wmsc/upload/file/pdf/v2/lcsc/2203252253_PROD-Tech-PWCWAQ2012F-6R8KTT_C2983047.pdf; ComponentLink2Description: JLCPCB Part URL; ComponentLink2URL: https://jlcpcb.com/partdetail/C2983047; ComponentLink3Description: LCSC Part URL; ComponentLink3URL: https://lcsc.com/product-detail/Inductors-SMD_PROD-Tech-PROD-Tech-PWCWAQ2012F-6R8KTT_C2983047.html
footprint IND-0805 (0805 (2012M) Inductor)
pins: 1, 2

## PWCWAQ2012F-100KTT
designator L?  Inductance: 10uH
Inductor, 10uH, ±10%, 1.105Ω, 600mA, SMD 0805; Manufacturer: PROD Tech; Manufacturer Part Number: PWCWAQ2012F-100KTT; Package Size: 0805; JLCPCB Basic Part: No; JLCPCB Part Number: C436790; Supplier 1: LCSC; Category: Inductors; Supplier Part Number 1: C436790; Tolerance: ±10%; Rated Current: 600mA; DC Resistance: 1.105Ω; RoHS: Yes; ComponentLink1Description: Datasheet; ComponentLink1URL: https://wmsc.lcsc.com/wmsc/upload/file/pdf/v2/lcsc/2211161730_PROD-Tech-PWCWAQ2012F-100KTT_C436790.pdf; ComponentLink2Description: JLCPCB Part URL; ComponentLink2URL: https://jlcpcb.com/partdetail/C436790; ComponentLink3Description: LCSC Part URL; ComponentLink3URL: https://lcsc.com/product-detail/Inductors-SMD_PROD-Tech-PROD-Tech-PWCWAQ2012F-100KTT_C436790.html
footprint IND-0805 (0805 (2012M) Inductor)
pins: 1, 2

## PWCWAQ2012F-150KTT
designator L?  Inductance: 15uH
Inductor, 15uH, ±10%, 1.82Ω, 380mA, SMD 0805; Manufacturer: PROD Tech; Manufacturer Part Number: PWCWAQ2012F-150KTT; Package Size: 0805; JLCPCB Basic Part: No; JLCPCB Part Number: C436791; Supplier 1: LCSC; Category: Inductors; Supplier Part Number 1: C436791; Tolerance: ±10%; Rated Current: 380mA; DC Resistance: 1.82Ω; RoHS: Yes; ComponentLink1Description: Datasheet; ComponentLink1URL: https://wmsc.lcsc.com/wmsc/upload/file/pdf/v2/lcsc/2211161730_PROD-Tech-PWCWAQ2012F-150KTT_C436791.pdf; ComponentLink2Description: JLCPCB Part URL; ComponentLink2URL: https://jlcpcb.com/partdetail/C436791; ComponentLink3Description: LCSC Part URL; ComponentLink3URL: https://lcsc.com/product-detail/Inductors-SMD_PROD-Tech-PROD-Tech-PWCWAQ2012F-150KTT_C436791.html
footprint IND-0805 (0805 (2012M) Inductor)
pins: 1, 2

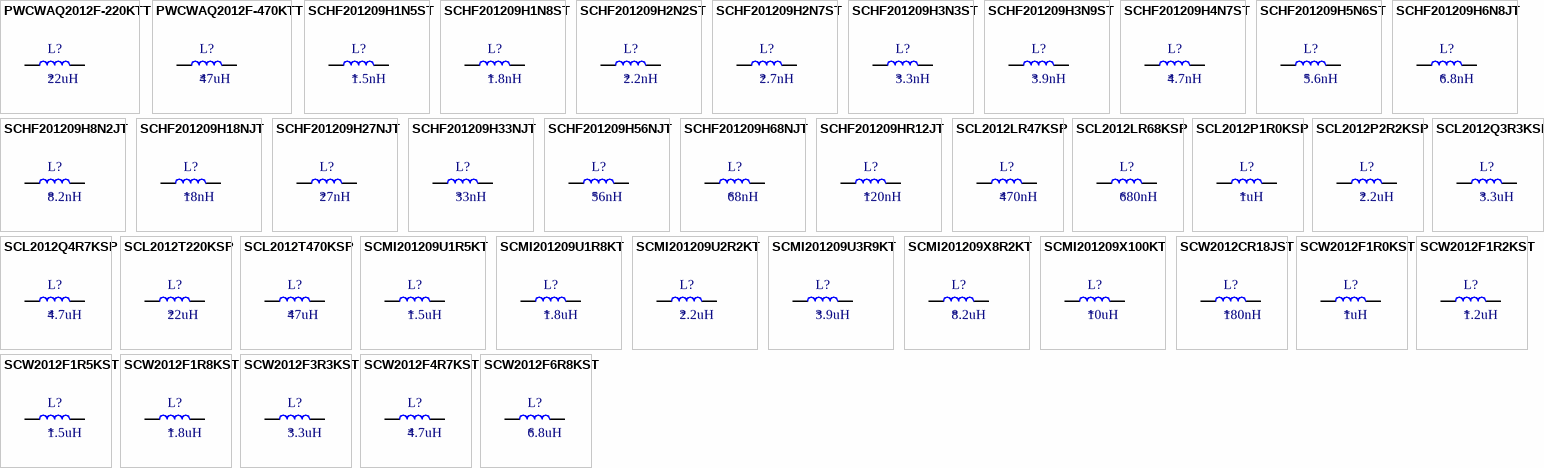
[diagram p18: symbols PWCWAQ2012F-220KTT to SCW2012F6R8KST]

## PWCWAQ2012F-220KTT
designator L?  Inductance: 22uH
Inductor, 22uH, ±10%, 2.288Ω, 340mA, SMD 0805; Manufacturer: PROD Tech; Manufacturer Part Number: PWCWAQ2012F-220KTT; Self-Resonant Frequency: 20MHz; Package Size: 0805; JLCPCB Basic Part: No; JLCPCB Part Number: C436792; Supplier 1: LCSC; Category: Inductors; Supplier Part Number 1: C436792; Tolerance: ±10%; Rated Current: 340mA; DC Resistance: 2.288Ω; RoHS: Yes; ComponentLink1Description: Datasheet; ComponentLink1URL: https://wmsc.lcsc.com/wmsc/upload/file/pdf/v2/lcsc/2211161730_PROD-Tech-PWCWAQ2012F-220KTT_C436792.pdf; ComponentLink2Description: JLCPCB Part URL; ComponentLink2URL: https://jlcpcb.com/partdetail/C436792; ComponentLink3Description: LCSC Part URL; ComponentLink3URL: https://lcsc.com/product-detail/Inductors-SMD_PROD-Tech-PROD-Tech-PWCWAQ2012F-220KTT_C436792.html
footprint IND-0805 (0805 (2012M) Inductor)
pins: 1, 2

## PWCWAQ2012F-470KTT
designator L?  Inductance: 47uH
Inductor, 47uH, ±10%, 4.42Ω, 160mA, SMD 0805; Manufacturer: PROD Tech; Manufacturer Part Number: PWCWAQ2012F-470KTT; Package Size: 0805; JLCPCB Basic Part: No; JLCPCB Part Number: C2983048; Supplier 1: LCSC; Category: Inductors; Supplier Part Number 1: C2983048; Tolerance: ±10%; Rated Current: 160mA; DC Resistance: 4.42Ω; RoHS: Yes; ComponentLink1Description: Datasheet; ComponentLink1URL: https://wmsc.lcsc.com/wmsc/upload/file/pdf/v2/lcsc/2203252253_PROD-Tech-PWCWAQ2012F-470KTT_C2983048.pdf; ComponentLink2Description: JLCPCB Part URL; ComponentLink2URL: https://jlcpcb.com/partdetail/C2983048; ComponentLink3Description: LCSC Part URL; ComponentLink3URL: https://lcsc.com/product-detail/Inductors-SMD_PROD-Tech-PROD-Tech-PWCWAQ2012F-470KTT_C2983048.html
footprint IND-0805 (0805 (2012M) Inductor)
pins: 1, 2

## SCHF201209H1N5ST
designator L?  Inductance: 1.5nH
Inductor, 1.5nH, 100mΩ, 600mA, SMD 0805; Manufacturer: Yanchuang; Manufacturer Part Number: SCHF201209H1N5ST; Package Size: 0805; JLCPCB Basic Part: No; JLCPCB Part Number: C578015; Supplier 1: LCSC; Category: Inductors; Supplier Part Number 1: C578015; Rated Current: 600mA; DC Resistance: 100mΩ; RoHS: Yes; ComponentLink1Description: Datasheet; ComponentLink1URL: https://wmsc.lcsc.com/wmsc/upload/file/pdf/v2/lcsc/2304140030_Yanchuang-SCHF201209H1N5ST_C578015.pdf; ComponentLink2Description: JLCPCB Part URL; ComponentLink2URL: https://jlcpcb.com/partdetail/C578015; ComponentLink3Description: LCSC Part URL; ComponentLink3URL: https://lcsc.com/product-detail/Inductors-SMD_Yanchuang-Yanchuang-SCHF201209H1N5ST_C578015.html
footprint IND-0805 (0805 (2012M) Inductor)
pins: 1, 2

## SCHF201209H1N8ST
designator L?  Inductance: 1.8nH
Inductor, 1.8nH, 100mΩ, 600mA, SMD 0805; Manufacturer: Yanchuang; Manufacturer Part Number: SCHF201209H1N8ST; Package Size: 0805; JLCPCB Basic Part: No; JLCPCB Part Number: C578016; Supplier 1: LCSC; Category: Inductors; Supplier Part Number 1: C578016; Rated Current: 600mA; DC Resistance: 100mΩ; RoHS: Yes; ComponentLink1Description: Datasheet; ComponentLink1URL: https://wmsc.lcsc.com/wmsc/upload/file/pdf/v2/lcsc/2304140030_Yanchuang-SCHF201209H1N8ST_C578016.pdf; ComponentLink2Description: JLCPCB Part URL; ComponentLink2URL: https://jlcpcb.com/partdetail/C578016; ComponentLink3Description: LCSC Part URL; ComponentLink3URL: https://lcsc.com/product-detail/Inductors-SMD_Yanchuang-Yanchuang-SCHF201209H1N8ST_C578016.html
footprint IND-0805 (0805 (2012M) Inductor)
pins: 1, 2

## SCHF201209H2N2ST
designator L?  Inductance: 2.2nH
Inductor, 2.2nH, 100mΩ, 600mA, SMD 0805; Manufacturer: Yanchuang; Manufacturer Part Number: SCHF201209H2N2ST; Package Size: 0805; JLCPCB Basic Part: No; JLCPCB Part Number: C578017; Supplier 1: LCSC; Category: Inductors; Supplier Part Number 1: C578017; Rated Current: 600mA; DC Resistance: 100mΩ; RoHS: Yes; ComponentLink1Description: Datasheet; ComponentLink1URL: https://wmsc.lcsc.com/wmsc/upload/file/pdf/v2/lcsc/2304140030_Yanchuang-SCHF201209H2N2ST_C578017.pdf; ComponentLink2Description: JLCPCB Part URL; ComponentLink2URL: https://jlcpcb.com/partdetail/C578017; ComponentLink3Description: LCSC Part URL; ComponentLink3URL: https://lcsc.com/product-detail/Inductors-SMD_Yanchuang-Yanchuang-SCHF201209H2N2ST_C578017.html
footprint IND-0805 (0805 (2012M) Inductor)
pins: 1, 2

## SCHF201209H2N7ST
designator L?  Inductance: 2.7nH
Inductor, 2.7nH, 100mΩ, 600mA, SMD 0805; Manufacturer: Yanchuang; Manufacturer Part Number: SCHF201209H2N7ST; Package Size: 0805; JLCPCB Basic Part: No; JLCPCB Part Number: C578018; Supplier 1: LCSC; Category: Inductors; Supplier Part Number 1: C578018; Rated Current: 600mA; DC Resistance: 100mΩ; RoHS: Yes; ComponentLink1Description: Datasheet; ComponentLink1URL: https://wmsc.lcsc.com/wmsc/upload/file/pdf/v2/lcsc/2304140030_Yanchuang-SCHF201209H2N7ST_C578018.pdf; ComponentLink2Description: JLCPCB Part URL; ComponentLink2URL: https://jlcpcb.com/partdetail/C578018; ComponentLink3Description: LCSC Part URL; ComponentLink3URL: https://lcsc.com/product-detail/Inductors-SMD_Yanchuang-Yanchuang-SCHF201209H2N7ST_C578018.html
footprint IND-0805 (0805 (2012M) Inductor)
pins: 1, 2

## SCHF201209H3N3ST
designator L?  Inductance: 3.3nH
Inductor, 3.3nH, 130mΩ, 600mA, SMD 0805; Manufacturer: Yanchuang; Manufacturer Part Number: SCHF201209H3N3ST; Package Size: 0805; JLCPCB Basic Part: No; JLCPCB Part Number: C578019; Supplier 1: LCSC; Category: Inductors; Supplier Part Number 1: C578019; Rated Current: 600mA; DC Resistance: 130mΩ; RoHS: Yes; ComponentLink1Description: Datasheet; ComponentLink1URL: https://wmsc.lcsc.com/wmsc/upload/file/pdf/v2/lcsc/2304140030_Yanchuang-SCHF201209H3N3ST_C578019.pdf; ComponentLink2Description: JLCPCB Part URL; ComponentLink2URL: https://jlcpcb.com/partdetail/C578019; ComponentLink3Description: LCSC Part URL; ComponentLink3URL: https://lcsc.com/product-detail/Inductors-SMD_Yanchuang-Yanchuang-SCHF201209H3N3ST_C578019.html
footprint IND-0805 (0805 (2012M) Inductor)
pins: 1, 2
